# Altium schematic symbol library 13-Logic 数字 IC.SchLib: 324 symbols (part 6 of 30) (continued)
## CY7C1460AV25-250BZ
designator IC?
36-Mbit (1M x 36) Pipelined SRAM with NoBL Architecture
part A pins: A2 A (in), A3 ~{CE1} (in), A4 ~{BWc} (in), A5 ~{BWb} (in), A6 ~{CE3} (in), A7 ~{CEN} (in), A8 ADV/~{LD} (in), A9 A (in), A10 A (in), B2 A (in), B3 CE2 (in), B4 ~{BWd} (in), B5 ~{BWa} (in), B6 CLK (in), B7 ~{WE} (in), B8 ~{OE} (in), B9 A (in), B10 A (in), C1 DQPc (io), C11 DQPb (io), D1 DQc (io), D2 DQc (io), D10 DQb (io), D11 DQb (io), E1 DQc (io), E2 DQc (io), E10 DQb (io), E11 DQb (io), F1 DQc (io), F2 DQc (io), F10 DQb (io), F11 DQb (io), G1 DQc (io), G2 DQc (io), G10 DQb (io), G11 DQb (io), H11 ZZ (in), J1 DQd (io), J2 DQd (io), J10 DQa (io), J11 DQa (io), K1 DQd (io), K2 DQd (io), K10 DQa (io), K11 DQa (io), L1 DQd (io), L2 DQd (io), L10 DQa (io), L11 DQa (io), M1 DQd (io), M2 DQd (io), M10 DQa (io), M11 DQa (io), N1 DQPd (io), N11 DQPa (io), P3 A (in), P4 A (in), P5 TDI (in), P6 A1 (in), P7 TDO (out), P8 A (in), P9 A (in), P10 A (in), R1 MODE (in), R2 A (in), R3 A (in), R4 A (in), R5 TMS (in), R6 A0 (in), R7 TCK (in), R8 A (in), R9 A (in), R10 A (in), R11 A (in)
part B pins: A1 NC/576M, A11 NC, B1 NC/1G, B11 NC, C2 NC, C3 VDDQ (power), C4 VSS (power), C5 VSS (power), C6 VSS (power), C7 VSS (power), C8 VSS (power), C9 VDDQ (power), C10 NC, D3 VDDQ (power), D4 VDD (power), D5 VSS (power), D6 VSS (power), D7 VSS (power), D8 VDD (power), D9 VDDQ (power), E3 VDDQ (power), E4 VDD (power), E5 VSS (power), E6 VSS (power), E7 VSS (power), E8 VDD (power), E9 VDDQ (power), F3 VDDQ (power), F4 VDD (power), F5 VSS (power), F6 VSS (power), F7 VSS (power), F8 VDD (power), F9 VDDQ (power), G3 VDDQ (power), G4 VDD (power), G5 VSS (power), G6 VSS (power), G7 VSS (power), G8 VDD (power), G9 VDDQ (power), H1 NC, H2 NC, H3 NC, H4 VDD (power), H5 VSS (power), H6 VSS (power), H7 VSS (power), H8 VDD (power), H9 NC, H10 NC, J3 VDDQ (power), J4 VDD (power), J5 VSS (power), J6 VSS (power), J7 VSS (power), J8 VDD (power), J9 VDDQ (power), K3 VDDQ (power), K4 VDD (power), K5 VSS (power), K6 VSS (power), K7 VSS (power), K8 VDD (power), K9 VDDQ (power), L3 VDDQ (power), L4 VDD (power), L5 VSS (power), L6 VSS (power), L7 VSS (power), L8 VDD (power), L9 VDDQ (power), M3 VDDQ (power), M4 VDD (power), M5 VSS (power), M6 VSS (power), M7 VSS (power), M8 VDD (power), M9 VDDQ (power), N2 NC (in), N3 VDDQ (power), N4 VSS (power), N5 NC, N6 NC, N7 NC, N8 VSS (power), N9 VDDQ (power), N10 NC, P1 NC/144M, P2 NC/72M, P11 NC/288M

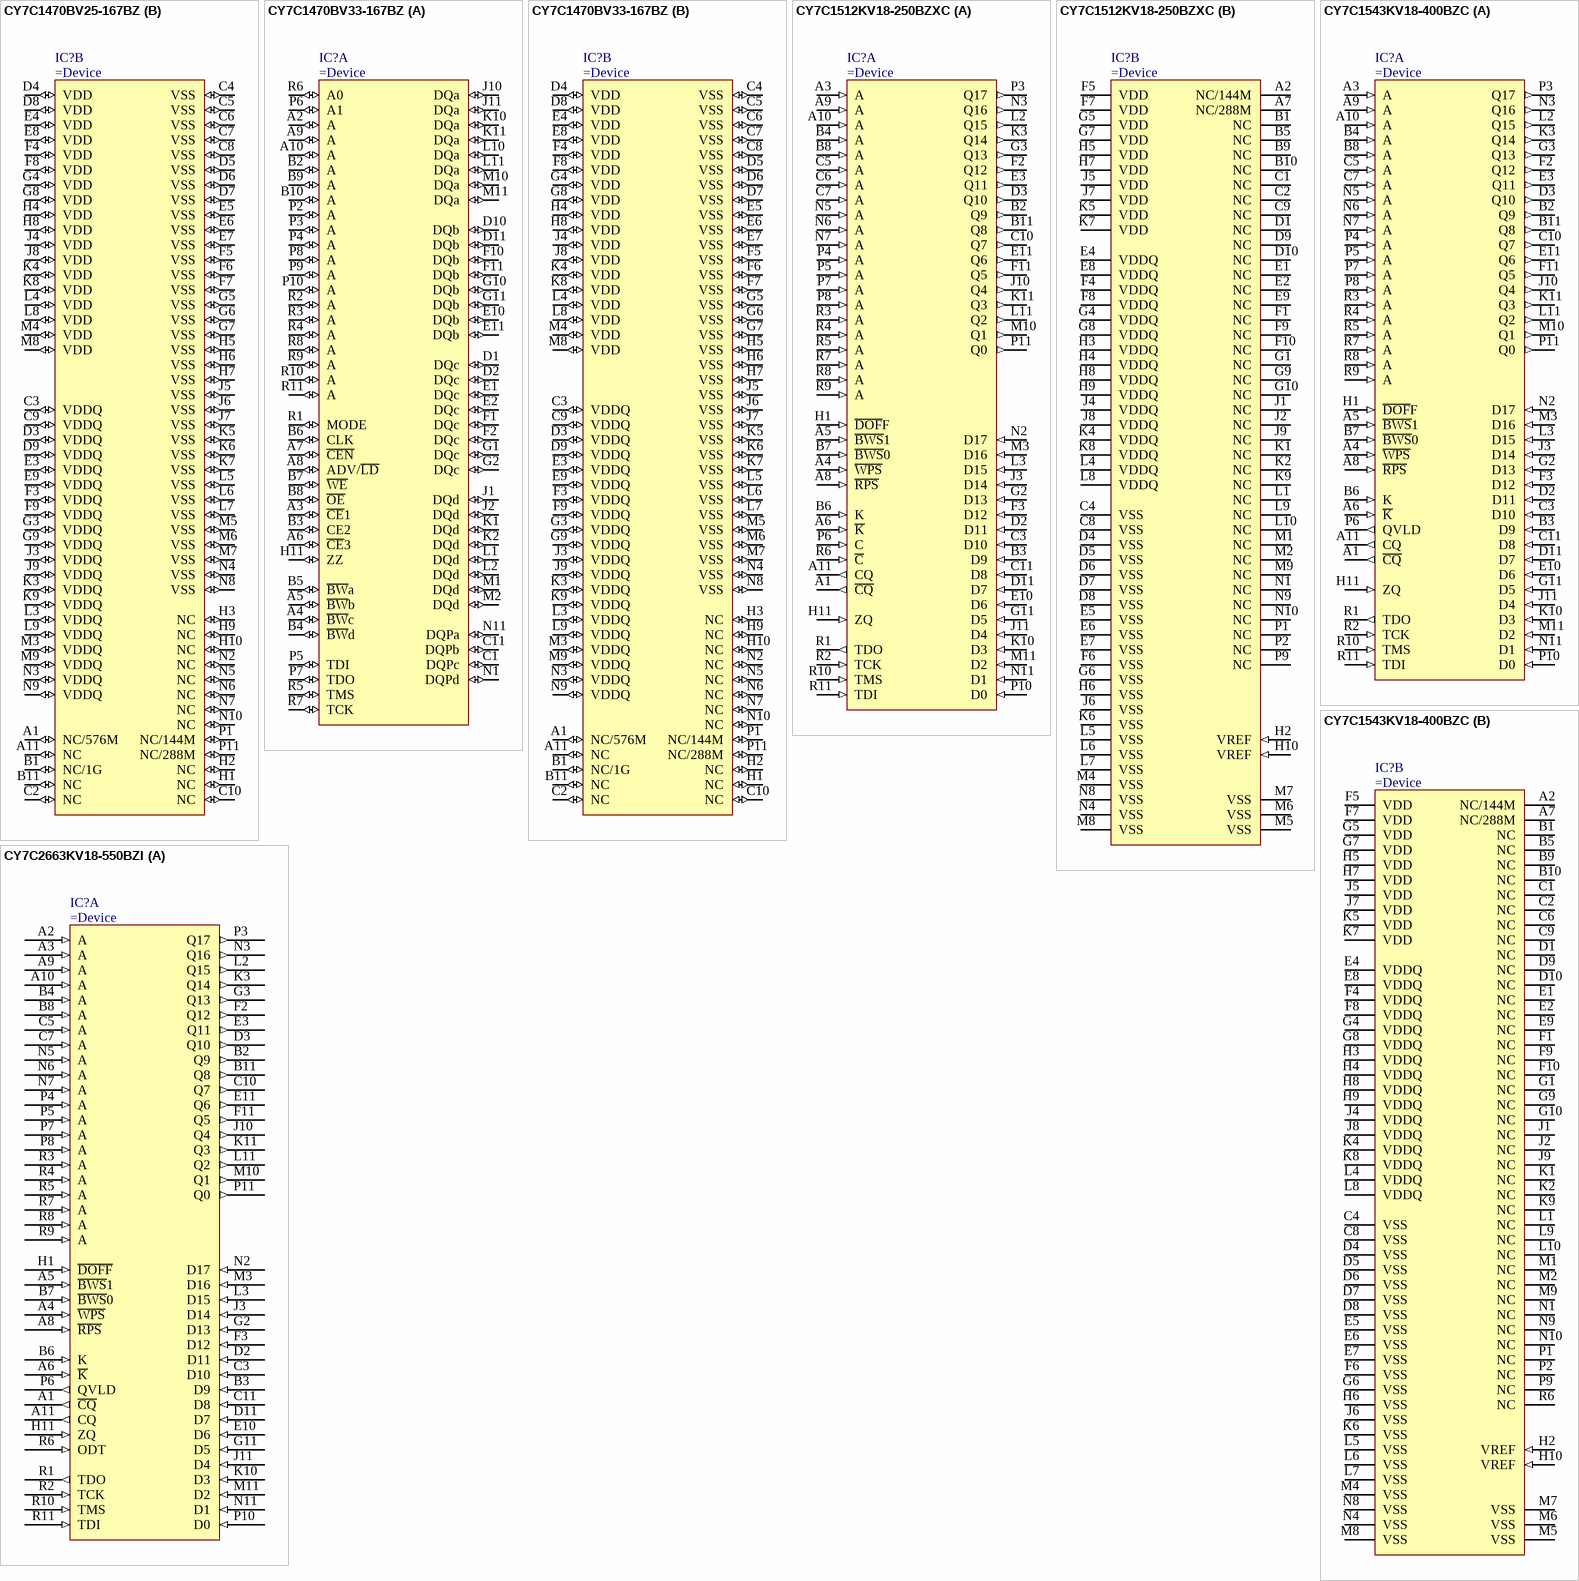
[diagram p34: symbols CY7C1470BV25-167BZ to CY7C2663KV18-550BZI]

## CY7C1470BV25-167BZ
designator IC?
72-Mbit (2M x 36) Pipelined SRAM with NoBL Architecture
part A pins: A2 A (io), A3 ~{CE}1 (io), A4 ~{BW}c (io), A5 ~{BW}b (io), A6 ~{CE}3 (io), A7 ~{CEN} (io), A8 ADV/~{LD} (io), A9 A (io), A10 A (io), B2 A (io), B3 CE2 (io), B4 ~{BW}d (io), B5 ~{BW}a (io), B6 CLK (io), B7 ~{WE} (io), B8 ~{OE} (io), B9 A (io), B10 A (io), C1 DQPc (io), C11 DQPb (io), D1 DQc (io), D2 DQc (io), D10 DQb (io), D11 DQb (io), E1 DQc (io), E2 DQc (io), E10 DQb (io), E11 DQb (io), F1 DQc (io), F2 DQc (io), F10 DQb (io), F11 DQb (io), G1 DQc (io), G2 DQc (io), G10 DQb (io), G11 DQb (io), H11 ZZ (io), J1 DQd (io), J2 DQd (io), J10 DQa (io), J11 DQa (io), K1 DQd (io), K2 DQd (io), K10 DQa (io), K11 DQa (io), L1 DQd (io), L2 DQd (io), L10 DQa (io), L11 DQa (io), M1 DQd (io), M2 DQd (io), M10 DQa (io), M11 DQa (io), N1 DQPd (io), N11 DQPa (io), P2 A (io), P3 A (io), P4 A (io), P5 TDI (io), P6 A1 (io), P7 TDO (io), P8 A (io), P9 A (io), P10 A (io), R1 MODE (io), R2 A (io), R3 A (io), R4 A (io), R5 TMS (io), R6 A0 (io), R7 TCK (io), R8 A (io), R9 A (io), R10 A (io), R11 A (io)
part B pins: A1 NC/576M (io), A11 NC (io), B1 NC/1G (io), B11 NC (io), C2 NC (io), C3 VDDQ (io), C4 VSS (io), C5 VSS (io), C6 VSS (io), C7 VSS (io), C8 VSS (io), C9 VDDQ (io), C10 NC (io), D3 VDDQ (io), D4 VDD (io), D5 VSS (io), D6 VSS (io), D7 VSS (io), D8 VDD (io), D9 VDDQ (io), E3 VDDQ (io), E4 VDD (io), E5 VSS (io), E6 VSS (io), E7 VSS (io), E8 VDD (io), E9 VDDQ (io), F3 VDDQ (io), F4 VDD (io), F5 VSS (io), F6 VSS (io), F7 VSS (io), F8 VDD (io), F9 VDDQ (io), G3 VDDQ (io), G4 VDD (io), G5 VSS (io), G6 VSS (io), G7 VSS (io), G8 VDD (io), G9 VDDQ (io), H1 NC (io), H2 NC (io), H3 NC (io), H4 VDD (io), H5 VSS (io), H6 VSS (io), H7 VSS (io), H8 VDD (io), H9 NC (io), H10 NC (io), J3 VDDQ (io), J4 VDD (io), J5 VSS (io), J6 VSS (io), J7 VSS (io), J8 VDD (io), J9 VDDQ (io), K3 VDDQ (io), K4 VDD (io), K5 VSS (io), K6 VSS (io), K7 VSS (io), K8 VDD (io), K9 VDDQ (io), L3 VDDQ (io), L4 VDD (io), L5 VSS (io), L6 VSS (io), L7 VSS (io), L8 VDD (io), L9 VDDQ (io), M3 VDDQ (io), M4 VDD (io), M5 VSS (io), M6 VSS (io), M7 VSS (io), M8 VDD (io), M9 VDDQ (io), N2 NC (io), N3 VDDQ (io), N4 VSS (io), N5 NC (io), N6 NC (io), N7 NC (io), N8 VSS (io), N9 VDDQ (io), N10 NC (io), P1 NC/144M (io), P11 NC/288M (io)

## CY7C1470BV33-167BZ
designator IC?
72-Mbit (2M x 36) Pipelined 3.3V SRAM with NoBL Architecture
part A pins: A2 A (io), A3 ~{CE}1 (io), A4 ~{BW}c (io), A5 ~{BW}b (io), A6 ~{CE}3 (io), A7 ~{CEN} (io), A8 ADV/~{LD} (io), A9 A (io), A10 A (io), B2 A (io), B3 CE2 (io), B4 ~{BW}d (io), B5 ~{BW}a (io), B6 CLK (io), B7 ~{WE} (io), B8 ~{OE} (io), B9 A (io), B10 A (io), C1 DQPc (io), C11 DQPb (io), D1 DQc (io), D2 DQc (io), D10 DQb (io), D11 DQb (io), E1 DQc (io), E2 DQc (io), E10 DQb (io), E11 DQb (io), F1 DQc (io), F2 DQc (io), F10 DQb (io), F11 DQb (io), G1 DQc (io), G2 DQc (io), G10 DQb (io), G11 DQb (io), H11 ZZ (io), J1 DQd (io), J2 DQd (io), J10 DQa (io), J11 DQa (io), K1 DQd (io), K2 DQd (io), K10 DQa (io), K11 DQa (io), L1 DQd (io), L2 DQd (io), L10 DQa (io), L11 DQa (io), M1 DQd (io), M2 DQd (io), M10 DQa (io), M11 DQa (io), N1 DQPd (io), N11 DQPa (io), P2 A (io), P3 A (io), P4 A (io), P5 TDI (io), P6 A1 (io), P7 TDO (io), P8 A (io), P9 A (io), P10 A (io), R1 MODE (io), R2 A (io), R3 A (io), R4 A (io), R5 TMS (io), R6 A0 (io), R7 TCK (io), R8 A (io), R9 A (io), R10 A (io), R11 A (io)
part B pins: A1 NC/576M (io), A11 NC (io), B1 NC/1G (io), B11 NC (io), C2 NC (io), C3 VDDQ (io), C4 VSS (io), C5 VSS (io), C6 VSS (io), C7 VSS (io), C8 VSS (io), C9 VDDQ (io), C10 NC (io), D3 VDDQ (io), D4 VDD (io), D5 VSS (io), D6 VSS (io), D7 VSS (io), D8 VDD (io), D9 VDDQ (io), E3 VDDQ (io), E4 VDD (io), E5 VSS (io), E6 VSS (io), E7 VSS (io), E8 VDD (io), E9 VDDQ (io), F3 VDDQ (io), F4 VDD (io), F5 VSS (io), F6 VSS (io), F7 VSS (io), F8 VDD (io), F9 VDDQ (io), G3 VDDQ (io), G4 VDD (io), G5 VSS (io), G6 VSS (io), G7 VSS (io), G8 VDD (io), G9 VDDQ (io), H1 NC (io), H2 NC (io), H3 NC (io), H4 VDD (io), H5 VSS (io), H6 VSS (io), H7 VSS (io), H8 VDD (io), H9 NC (io), H10 NC (io), J3 VDDQ (io), J4 VDD (io), J5 VSS (io), J6 VSS (io), J7 VSS (io), J8 VDD (io), J9 VDDQ (io), K3 VDDQ (io), K4 VDD (io), K5 VSS (io), K6 VSS (io), K7 VSS (io), K8 VDD (io), K9 VDDQ (io), L3 VDDQ (io), L4 VDD (io), L5 VSS (io), L6 VSS (io), L7 VSS (io), L8 VDD (io), L9 VDDQ (io), M3 VDDQ (io), M4 VDD (io), M5 VSS (io), M6 VSS (io), M7 VSS (io), M8 VDD (io), M9 VDDQ (io), N2 NC (io), N3 VDDQ (io), N4 VSS (io), N5 NC (io), N6 NC (io), N7 NC (io), N8 VSS (io), N9 VDDQ (io), N10 NC (io), P1 NC/144M (io), P11 NC/288M (io)

## CY7C1512KV18-250BZXC
designator IC?
72-Mbit QDR® II SRAM 2-Word Burst Architecture
part A pins: A1 ~{CQ} (out), A3 A (in), A4 ~{WPS} (in), A5 ~{BWS}1 (in), A6 ~{K} (in), A8 ~{RPS} (in), A9 A (in), A10 A (in), A11 CQ (out), B2 Q9 (out), B3 D9 (in), B4 A (in), B6 K (in), B7 ~{BWS}0 (in), B8 A (in), B11 Q8 (out), C3 D10 (in), C5 A (in), C6 A (in), C7 A (in), C10 Q7 (out), C11 D8 (in), D2 D11 (in), D3 Q10 (out), D11 D7 (in), E3 Q11 (out), E10 D6 (in), E11 Q6 (out), F2 Q12 (out), F3 D12 (in), F11 Q5 (out), G2 D13 (in), G3 Q13 (out), G11 D5 (in), H1 ~{DOF}F (in), H11 ZQ (in), J3 D14 (in), J10 Q4 (out), J11 D4 (in), K3 Q14 (out), K10 D3 (in), K11 Q3 (out), L2 Q15 (out), L3 D15 (in), L11 Q2 (out), M3 D16 (in), M10 Q1 (out), M11 D2 (in), N2 D17 (in), N3 Q16 (out), N5 A (in), N6 A (in), N7 A (in), N11 D1 (in), P3 Q17 (out), P4 A (in), P5 A (in), P6 C (in), P7 A (in), P8 A (in), P10 D0 (in), P11 Q0 (out), R1 TDO (out), R2 TCK (in), R3 A (in), R4 A (in), R5 A (in), R6 ~{C} (in), R7 A (in), R8 A (in), R9 A (in), R10 TMS (in), R11 TDI (in)
part B pins: A2 NC/144M, A7 NC/288M, B1 NC, B5 NC, B9 NC, B10 NC, C1 NC, C2 NC, C4 VSS (power), C8 VSS (power), C9 NC, D1 NC, D4 VSS (power), D5 VSS (power), D6 VSS (power), D7 VSS (power), D8 VSS (power), D9 NC, D10 NC, E1 NC, E2 NC, E4 VDDQ (power), E5 VSS (power), E6 VSS (power), E7 VSS (power), E8 VDDQ (power), E9 NC, F1 NC, F4 VDDQ (power), F5 VDD (power), F6 VSS (power), F7 VDD (power), F8 VDDQ (power), F9 NC, F10 NC, G1 NC, G4 VDDQ (power), G5 VDD (power), G6 VSS (power), G7 VDD (power), G8 VDDQ (power), G9 NC, G10 NC, H2 VREF (in), H3 VDDQ (power), H4 VDDQ (power), H5 VDD (power), H6 VSS (power), H7 VDD (power), H8 VDDQ (power), H9 VDDQ (power), H10 VREF (in), J1 NC, J2 NC, J4 VDDQ (power), J5 VDD (power), J6 VSS (power), J7 VDD (power), J8 VDDQ (power), J9 NC, K1 NC, K2 NC, K4 VDDQ (power), K5 VDD (power), K6 VSS (power), K7 VDD (power), K8 VDDQ (power), K9 NC, L1 NC, L4 VDDQ (power), L5 VSS (power), L6 VSS (power), L7 VSS (power), L8 VDDQ (power), L9 NC, L10 NC, M1 NC, M2 NC, M4 VSS (power), M5 VSS (power), M6 VSS (power), M7 VSS (power), M8 VSS (power), M9 NC, N1 NC, N4 VSS (power), N8 VSS (power), N9 NC, N10 NC, P1 NC, P2 NC, P9 NC

## CY7C1543KV18-400BZC
designator IC?
72-Mbit QDR®II+ SRAM 4-Word Burst Architecture (2.0 Cycle Read Latency)
part A pins: A1 ~{CQ} (out), A3 A (in), A4 ~{WPS} (in), A5 ~{BWS}1 (in), A6 ~{K} (in), A8 ~{RPS} (in), A9 A (in), A10 A (in), A11 CQ (out), B2 Q9 (out), B3 D9 (in), B4 A (in), B6 K (in), B7 ~{BWS}0 (in), B8 A (in), B11 Q8 (out), C3 D10 (in), C5 A (in), C7 A (in), C10 Q7 (out), C11 D8 (in), D2 D11 (in), D3 Q10 (out), D11 D7 (in), E3 Q11 (out), E10 D6 (in), E11 Q6 (out), F2 Q12 (out), F3 D12 (in), F11 Q5 (out), G2 D13 (in), G3 Q13 (out), G11 D5 (in), H1 ~{DOF}F (in), H11 ZQ (in), J3 D14 (in), J10 Q4 (out), J11 D4 (in), K3 Q14 (out), K10 D3 (in), K11 Q3 (out), L2 Q15 (out), L3 D15 (in), L11 Q2 (out), M3 D16 (in), M10 Q1 (out), M11 D2 (in), N2 D17 (in), N3 Q16 (out), N5 A (in), N6 A (in), N7 A (in), N11 D1 (in), P3 Q17 (out), P4 A (in), P5 A (in), P6 QVLD (out), P7 A (in), P8 A (in), P10 D0 (in), P11 Q0 (out), R1 TDO (out), R2 TCK (in), R3 A (in), R4 A (in), R5 A (in), R7 A (in), R8 A (in), R9 A (in), R10 TMS (in), R11 TDI (in)
part B pins: A2 NC/144M, A7 NC/288M, B1 NC, B5 NC, B9 NC, B10 NC, C1 NC, C2 NC, C4 VSS (power), C6 NC, C8 VSS (power), C9 NC, D1 NC, D4 VSS (power), D5 VSS (power), D6 VSS (power), D7 VSS (power), D8 VSS (power), D9 NC, D10 NC, E1 NC, E2 NC, E4 VDDQ (power), E5 VSS (power), E6 VSS (power), E7 VSS (power), E8 VDDQ (power), E9 NC, F1 NC, F4 VDDQ (power), F5 VDD (power), F6 VSS (power), F7 VDD (power), F8 VDDQ (power), F9 NC, F10 NC, G1 NC, G4 VDDQ (power), G5 VDD (power), G6 VSS (power), G7 VDD (power), G8 VDDQ (power), G9 NC, G10 NC, H2 VREF (in), H3 VDDQ (power), H4 VDDQ (power), H5 VDD (power), H6 VSS (power), H7 VDD (power), H8 VDDQ (power), H9 VDDQ (power), H10 VREF (in), J1 NC, J2 NC, J4 VDDQ (power), J5 VDD (power), J6 VSS (power), J7 VDD (power), J8 VDDQ (power), J9 NC, K1 NC, K2 NC, K4 VDDQ (power), K5 VDD (power), K6 VSS (power), K7 VDD (power), K8 VDDQ (power), K9 NC, L1 NC, L4 VDDQ (power), L5 VSS (power), L6 VSS (power), L7 VSS (power), L8 VDDQ (power), L9 NC, L10 NC, M1 NC, M2 NC, M4 VSS (power), M5 VSS (power), M6 VSS (power), M7 VSS (power), M8 VSS (power), M9 NC, N1 NC, N4 VSS (power), N8 VSS (power), N9 NC, N10 NC, P1 NC, P2 NC, P9 NC, R6 NC

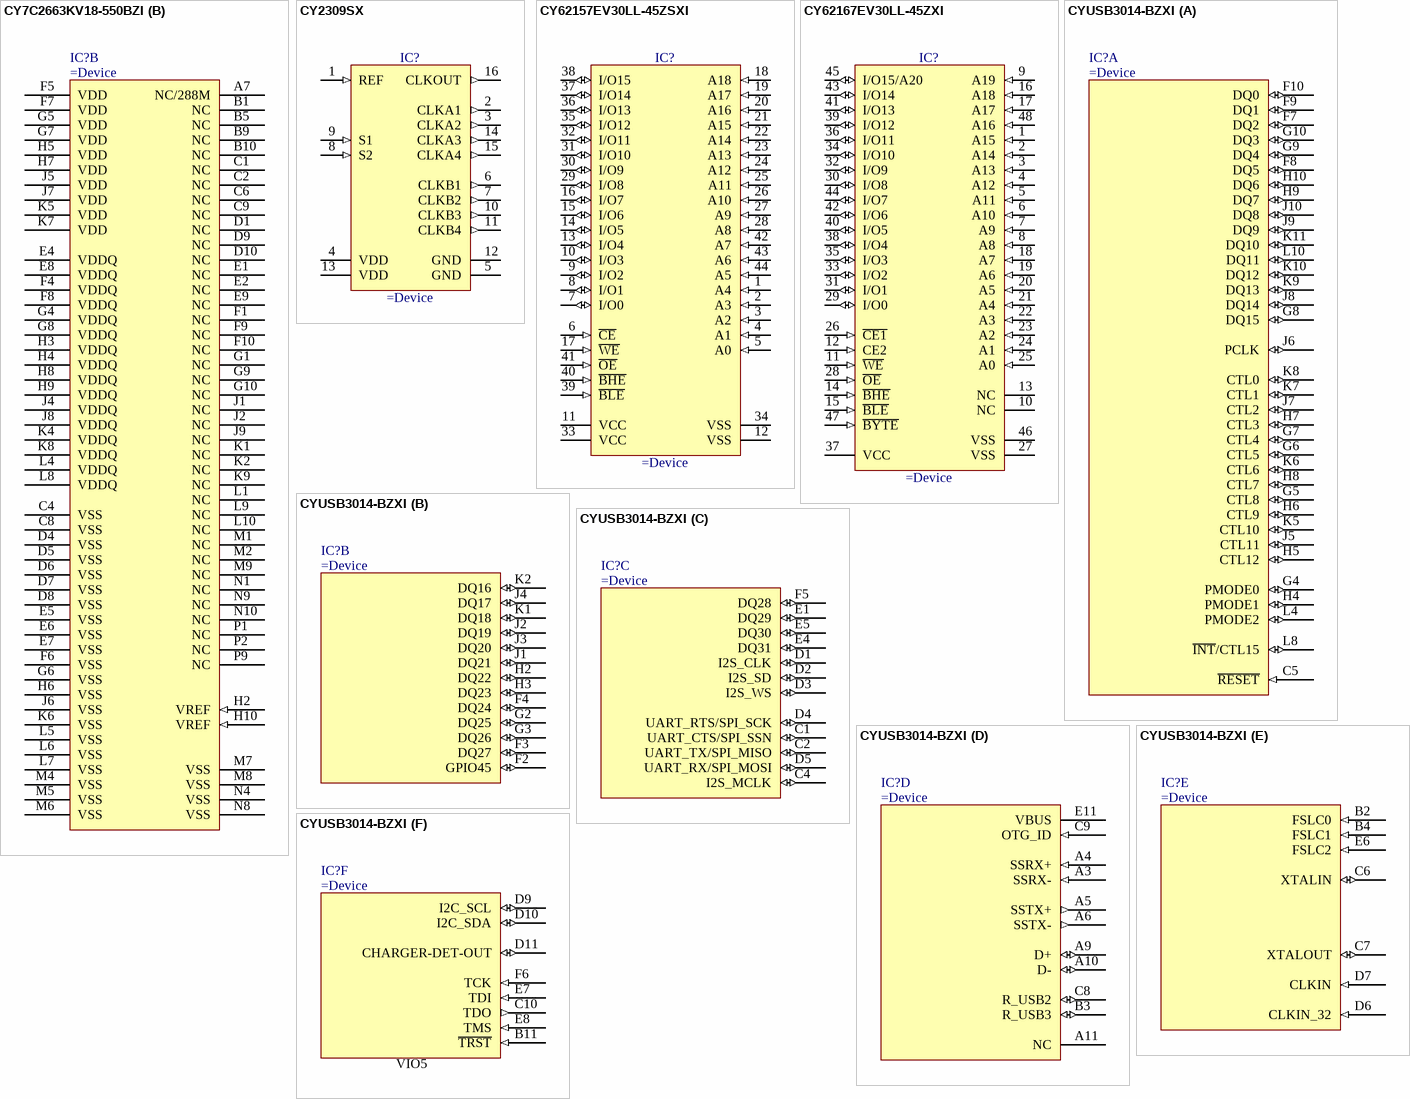
[diagram p35: symbols CY7C2663KV18-550BZI to CYUSB3014-BZXI]

## CY7C2663KV18-550BZI
designator IC?
144-Mbit QDR® II+ SRAM Four-Word Burst Architecture (2.5 Cycle Read Latency) with ODT
part A pins: A1 ~{CQ} (out), A2 A (in), A3 A (in), A4 ~{WPS} (in), A5 ~{BWS}1 (in), A6 ~{K} (in), A8 ~{RPS} (in), A9 A (in), A10 A (in), A11 CQ (out), B2 Q9 (out), B3 D9 (in), B4 A (in), B6 K (in), B7 ~{BWS}0 (in), B8 A (in), B11 Q8 (out), C3 D10 (in), C5 A (in), C7 A (in), C10 Q7 (out), C11 D8 (in), D2 D11 (in), D3 Q10 (out), D11 D7 (in), E3 Q11 (out), E10 D6 (in), E11 Q6 (out), F2 Q12 (out), F3 D12 (in), F11 Q5 (out), G2 D13 (in), G3 Q13 (out), G11 D5 (in), H1 ~{DOFF} (in), H11 ZQ (in), J3 D14 (in), J10 Q4 (out), J11 D4 (in), K3 Q14 (out), K10 D3 (in), K11 Q3 (out), L2 Q15 (out), L3 D15 (in), L11 Q2 (out), M3 D16 (in), M10 Q1 (out), M11 D2 (in), N2 D17 (in), N3 Q16 (out), N5 A (in), N6 A (in), N7 A (in), N11 D1 (in), P3 Q17 (out), P4 A (in), P5 A (in), P6 QVLD (out), P7 A (in), P8 A (in), P10 D0 (in), P11 Q0 (out), R1 TDO (out), R2 TCK (in), R3 A (in), R4 A (in), R5 A (in), R6 ODT (in), R7 A (in), R8 A (in), R9 A (in), R10 TMS (in), R11 TDI (in)
part B pins: A7 NC/288M, B1 NC, B5 NC, B9 NC, B10 NC, C1 NC, C2 NC, C4 VSS (power), C6 NC, C8 VSS (power), C9 NC, D1 NC, D4 VSS (power), D5 VSS (power), D6 VSS (power), D7 VSS (power), D8 VSS (power), D9 NC, D10 NC, E1 NC, E2 NC, E4 VDDQ (power), E5 VSS (power), E6 VSS (power), E7 VSS (power), E8 VDDQ (power), E9 NC, F1 NC, F4 VDDQ (power), F5 VDD (power), F6 VSS (power), F7 VDD (power), F8 VDDQ (power), F9 NC, F10 NC, G1 NC, G4 VDDQ (power), G5 VDD (power), G6 VSS (power), G7 VDD (power), G8 VDDQ (power), G9 NC, G10 NC, H2 VREF (in), H3 VDDQ (power), H4 VDDQ (power), H5 VDD (power), H6 VSS (power), H7 VDD (power), H8 VDDQ (power), H9 VDDQ (power), H10 VREF (in), J1 NC, J2 NC, J4 VDDQ (power), J5 VDD (power), J6 VSS (power), J7 VDD (power), J8 VDDQ (power), J9 NC, K1 NC, K2 NC, K4 VDDQ (power), K5 VDD (power), K6 VSS (power), K7 VDD (power), K8 VDDQ (power), K9 NC, L1 NC, L4 VDDQ (power), L5 VSS (power), L6 VSS (power), L7 VSS (power), L8 VDDQ (power), L9 NC, L10 NC, M1 NC, M2 NC, M4 VSS (power), M5 VSS (power), M6 VSS (power), M7 VSS (power), M8 VSS (power), M9 NC, N1 NC, N4 VSS (power), N8 VSS (power), N9 NC, N10 NC, P1 NC, P2 NC, P9 NC

## CY2309SX
designator IC?
Low Cost 3.3-V Zero Delay Buffer
pins: 1 REF (in), 2 CLKA1 (out), 3 CLKA2 (out), 4 VDD (power), 5 GND (power), 6 CLKB1 (out), 7 CLKB2 (out), 8 S2 (in), 9 S1 (in), 10 CLKB3 (out), 11 CLKB4 (out), 12 GND (power), 13 VDD (power), 14 CLKA3 (out), 15 CLKA4 (out), 16 CLKOUT (out)

## CY62157EV30LL-45ZSXI
designator IC?
8-Mbit (512 K × 16) Static RAM
pins: 1 A4 (in), 2 A3 (in), 3 A2 (in), 4 A1 (in), 5 A0 (in), 6 ~{CE} (in), 7 I/O0 (io), 8 I/O1 (io), 9 I/O2 (io), 10 I/O3 (io), 11 VCC (power), 12 VSS (power), 13 I/O4 (io), 14 I/O5 (io), 15 I/O6 (io), 16 I/O7 (io), 17 ~{WE} (in), 18 A18 (in), 19 A17 (in), 20 A16 (in), 21 A15 (in), 22 A14 (in), 23 A13 (in), 24 A12 (in), 25 A11 (in), 26 A10 (in), 27 A9 (in), 28 A8 (in), 29 I/O8 (io), 30 I/O9 (io), 31 I/O10 (io), 32 I/O11 (io), 33 VCC (power), 34 VSS (power), 35 I/O12 (io), 36 I/O13 (io), 37 I/O14 (io), 38 I/O15 (io), 39 ~{BLE} (in), 40 ~{BHE} (in), 41 ~{OE} (in), 42 A7 (in), 43 A6 (in), 44 A5 (in)

## CY62167EV30LL-45ZXI
designator IC?
16Mbit (1M x 16), 2.2V to 3.6V Static RAM
pins: 1 A15 (in), 2 A14 (in), 3 A13 (in), 4 A12 (in), 5 A11 (in), 6 A10 (in), 7 A9 (in), 8 A8 (in), 9 A19 (in), 10 NC, 11 ~{WE} (in), 12 CE2 (in), 13 NC, 14 ~{BHE} (in), 15 ~{BLE} (in), 16 A18 (in), 17 A17 (in), 18 A7 (in), 19 A6 (in), 20 A5 (in), 21 A4 (in), 22 A3 (in), 23 A2 (in), 24 A1 (in), 25 A0 (in), 26 ~{CE1} (in), 27 VSS (power), 28 ~{OE} (in), 29 I/O0 (io), 30 I/O8 (io), 31 I/O1 (io), 32 I/O9 (io), 33 I/O2 (io), 34 I/O10 (io), 35 I/O3 (io), 36 I/O11 (io), 37 VCC (power), 38 I/O4 (io), 39 I/O12 (io), 40 I/O5 (io), 41 I/O13 (io), 42 I/O6 (io), 43 I/O14 (io), 44 I/O7 (io), 45 I/O15/A20 (io), 46 VSS (power), 47 ~{BYTE} (in), 48 A16 (in)

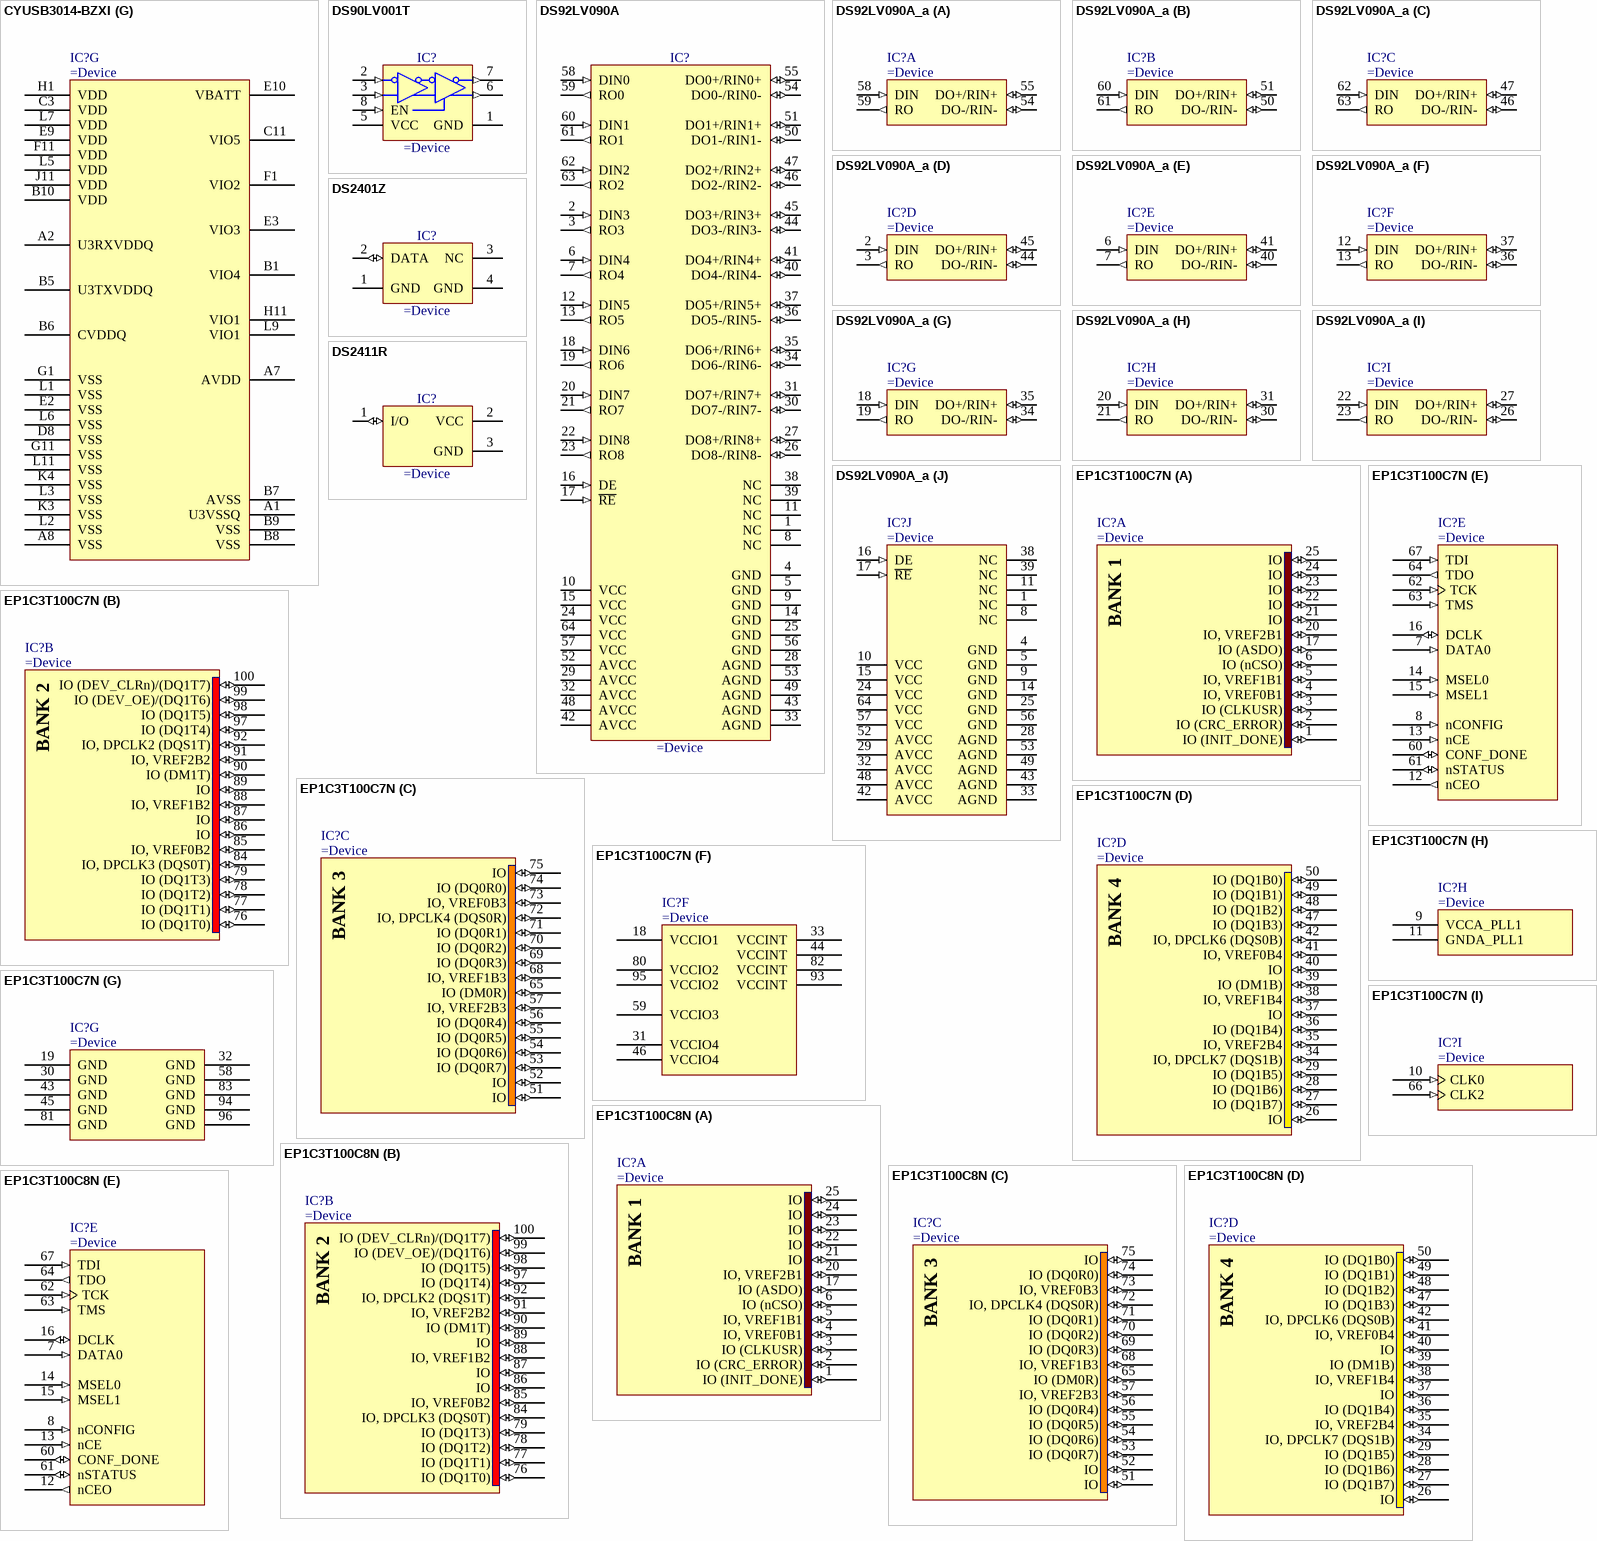
[diagram p36: symbols CYUSB3014-BZXI to EP1C3T100C8N]

## CYUSB3014-BZXI
designator IC?
EZ-USB® FX3 SuperSpeed USB Controller
part A pins: C5 ~{RESET} (in), F7 DQ2 (io), F8 DQ5 (io), F9 DQ1 (io), F10 DQ0 (io), G4 PMODE0 (io), G5 CTL8 (io), G6 CTL5 (io), G7 CTL4 (io), G8 DQ15 (io), G9 DQ4 (io), G10 DQ3 (io), H4 PMODE1 (io), H5 CTL12 (io), H6 CTL9 (io), H7 CTL3 (io), H8 CTL7 (io), H9 DQ7 (io), H10 DQ6 (io), J5 CTL11 (io), J6 PCLK (io), J7 CTL2 (io), J8 DQ14 (io), J9 DQ9 (io), J10 DQ8 (io), K5 CTL10 (io), K6 CTL6 (io), K7 CTL1 (io), K8 CTL0 (io), K9 DQ13 (io), K10 DQ12 (io), K11 DQ10 (io), L4 PMODE2 (io), L8 ~{INT}/CTL15 (io), L10 DQ11 (io)
part B pins: F2 GPIO45 (io), F3 DQ27 (io), F4 DQ24 (io), G2 DQ25 (io), G3 DQ26 (io), H2 DQ22 (io), H3 DQ23 (io), J1 DQ21 (io), J2 DQ19 (io), J3 DQ20 (io), J4 DQ17 (io), K1 DQ18 (io), K2 DQ16 (io)
part C pins: C1 UART_CTS/SPI_SSN (io), C2 UART_TX/SPI_MISO (io), C4 I2S_MCLK (io), D1 I2S_CLK (io), D2 I2S_SD (io), D3 I2S_WS (io), D4 UART_RTS/SPI_SCK (io), D5 UART_RX/SPI_MOSI (io), E1 DQ29 (io), E4 DQ31 (io), E5 DQ30 (io), F5 DQ28 (io)
part D pins: A3 SSRX- (in), A4 SSRX+ (in), A5 SSTX+ (out), A6 SSTX- (out), A9 D+ (io), A10 D- (io), A11 NC, B3 R_USB3 (io), C8 R_USB2 (io), C9 OTG_ID (in), E11 VBUS (power)
part E pins: B2 FSLC0 (in), B4 FSLC1 (in), C6 XTALIN (io), C7 XTALOUT (io), D6 CLKIN_32 (in), D7 CLKIN (in), E6 FSLC2 (in)
part F pins: B11 ~{TRST} (in), C10 TDO (out), D9 I2C_SCL (io), D10 I2C_SDA (io), D11 CHARGER-DET-OUT (io), E7 TDI (in), E8 TMS (in), F6 TCK (in)
part G pins: A1 U3VSSQ (power), A2 U3RXVDDQ (power), A7 AVDD (power), A8 VSS (power), B1 VIO4 (power), B5 U3TXVDDQ (power), B6 CVDDQ (power), B7 AVSS (power), B8 VSS (power), B9 VSS (power), B10 VDD (power), C3 VDD (power), C11 VIO5 (power), D8 VSS (power), E2 VSS (power), E3 VIO3 (power), E9 VDD (power), E10 VBATT (power), F1 VIO2 (power), F11 VDD (power), G1 VSS (power), G11 VSS (power), H1 VDD (power), H11 VIO1 (power), J11 VDD (power), K3 VSS (power), K4 VSS (power), L1 VSS (power), L2 VSS (power), L3 VSS (power), L5 VDD (power), L6 VSS (power), L7 VDD (power), L9 VIO1 (power), L11 VSS (power)

## DS90LV001T
designator IC?
800 Mbps LVDS Buffer
pins: 1 GND (power), 2 IN- (in), 3 IN+ (in), 5 VCC (power), 6 OUT+ (out), 7 OUT- (out), 8 EN (in)

## DS92LV090A
designator IC?
9 Channel Bus LVDS Transceiver
pins: 1 NC, 2 DIN3 (in), 3 RO3 (out), 4 GND (power), 5 GND (power), 6 DIN4 (in), 7 RO4 (out), 8 NC, 9 GND (power), 10 VCC (power), 11 NC, 12 DIN5 (in), 13 RO5 (out), 14 GND (power), 15 VCC (power), 16 DE (in), 17 ~{RE} (in), 18 DIN6 (in), 19 RO6 (out), 20 DIN7 (in), 21 RO7 (out), 22 DIN8 (in), 23 RO8 (out), 24 VCC (power), 25 GND (power), 26 DO8-/RIN8- (io), 27 DO8+/RIN8+ (io), 28 AGND (power), 29 AVCC (power), 30 DO7-/RIN7- (io), 31 DO7+/RIN7+ (io), 32 AVCC (power), 33 AGND (power), 34 DO6-/RIN6- (io), 35 DO6+/RIN6+ (io), 36 DO5-/RIN5- (io), 37 DO5+/RIN5+ (io), 38 NC, 39 NC, 40 DO4-/RIN4- (io), 41 DO4+/RIN4+ (io), 42 AVCC (power), 43 AGND (power), 44 DO3-/RIN3- (io), 45 DO3+/RIN3+ (io), 46 DO2-/RIN2- (io), 47 DO2+/RIN2+ (io), 48 AVCC (power), 49 AGND (power), 50 DO1-/RIN1- (io), 51 DO1+/RIN1+ (io), 52 AVCC (power), 53 AGND (power), 54 DO0-/RIN0- (io), 55 DO0+/RIN0+ (io), 56 GND (power), 57 VCC (power), 58 DIN0 (in), 59 RO0 (out), 60 DIN1 (in), 61 RO1 (out), 62 DIN2 (in), 63 RO2 (out), 64 VCC (power)

## DS92LV090A_a
designator IC?
9 Channel Bus LVDS Transceiver
part A pins: 54 DO-/RIN- (io), 55 DO+/RIN+ (io), 58 DIN (in), 59 RO (out)
part B pins: 50 DO-/RIN- (io), 51 DO+/RIN+ (io), 60 DIN (in), 61 RO (out)
part C pins: 46 DO-/RIN- (io), 47 DO+/RIN+ (io), 62 DIN (in), 63 RO (out)
part D pins: 2 DIN (in), 3 RO (out), 44 DO-/RIN- (io), 45 DO+/RIN+ (io)
part E pins: 6 DIN (in), 7 RO (out), 40 DO-/RIN- (io), 41 DO+/RIN+ (io)
part F pins: 12 DIN (in), 13 RO (out), 36 DO-/RIN- (io), 37 DO+/RIN+ (io)
part G pins: 18 DIN (in), 19 RO (out), 34 DO-/RIN- (io), 35 DO+/RIN+ (io)
part H pins: 20 DIN (in), 21 RO (out), 30 DO-/RIN- (io), 31 DO+/RIN+ (io)
part I pins: 22 DIN (in), 23 RO (out), 26 DO-/RIN- (io), 27 DO+/RIN+ (io)
part J pins: 1 NC, 4 GND (power), 5 GND (power), 8 NC, 9 GND (power), 10 VCC (power), 11 NC, 14 GND (power), 15 VCC (power), 16 DE (in), 17 ~{RE} (in), 24 VCC (power), 25 GND (power), 28 AGND (power), 29 AVCC (power), 32 AVCC (power), 33 AGND (power), 38 NC, 39 NC, 42 AVCC (power), 43 AGND (power), 48 AVCC (power), 49 AGND (power), 52 AVCC (power), 53 AGND (power), 56 GND (power), 57 VCC (power), 64 VCC (power)

## DS2401Z
designator IC?
Silicon Serial Number
pins: 1 GND (power), 2 DATA (io), 3 NC, 4 GND (power)

## DS2411R
designator IC?
Silicon Serial Number with VCC Input
pins: 1 I/O (io), 2 VCC (power), 3 GND (power)

## EP1C3T100C7N
designator IC?
Cyclone Family, 1.5V FPGA, 65 I/O Pins, 1 x PLL, Commercial Grade, Speed Grade 7, Pb-Free
part A pins: 1 IO (INIT_DONE) (io), 2 IO (CRC_ERROR) (io), 3 IO (CLKUSR) (io), 4 IO, VREF0B1 (io), 5 IO, VREF1B1 (io), 6 IO (nCSO) (io), 17 IO (ASDO) (io), 20 IO, VREF2B1 (io), 21 IO (io), 22 IO (io), 23 IO (io), 24 IO (io), 25 IO (io)
part B pins: 76 IO (DQ1T0) (io), 77 IO (DQ1T1) (io), 78 IO (DQ1T2) (io), 79 IO (DQ1T3) (io), 84 IO, DPCLK3 (DQS0T) (io), 85 IO, VREF0B2 (io), 86 IO (io), 87 IO (io), 88 IO, VREF1B2 (io), 89 IO (io), 90 IO (DM1T) (io), 91 IO, VREF2B2 (io), 92 IO, DPCLK2 (DQS1T) (io), 97 IO (DQ1T4) (io), 98 IO (DQ1T5) (io), 99 IO (DEV_OE)/(DQ1T6) (io), 100 IO (DEV_CLRn)/(DQ1T7) (io)
part C pins: 51 IO (io), 52 IO (io), 53 IO (DQ0R7) (io), 54 IO (DQ0R6) (io), 55 IO (DQ0R5) (io), 56 IO (DQ0R4) (io), 57 IO, VREF2B3 (io), 65 IO (DM0R) (io), 68 IO, VREF1B3 (io), 69 IO (DQ0R3) (io), 70 IO (DQ0R2) (io), 71 IO (DQ0R1) (io), 72 IO, DPCLK4 (DQS0R) (io), 73 IO, VREF0B3 (io), 74 IO (DQ0R0) (io), 75 IO (io)
part D pins: 26 IO (io), 27 IO (DQ1B7) (io), 28 IO (DQ1B6) (io), 29 IO (DQ1B5) (io), 34 IO, DPCLK7 (DQS1B) (io), 35 IO, VREF2B4 (io), 36 IO (DQ1B4) (io), 37 IO (io), 38 IO, VREF1B4 (io), 39 IO (DM1B) (io), 40 IO (io), 41 IO, VREF0B4 (io), 42 IO, DPCLK6 (DQS0B) (io), 47 IO (DQ1B3) (io), 48 IO (DQ1B2) (io), 49 IO (DQ1B1) (io), 50 IO (DQ1B0) (io)
part E pins: 7 DATA0 (in), 8 nCONFIG (in), 12 nCEO (out), 13 nCE (in), 14 MSEL0 (in), 15 MSEL1 (in), 16 DCLK (io), 60 CONF_DONE (io), 61 nSTATUS (io), 62 TCK (in), 63 TMS (in), 64 TDO (out), 67 TDI (in)
part F pins: 18 VCCIO1 (power), 31 VCCIO4 (power), 33 VCCINT (power), 44 VCCINT (power), 46 VCCIO4 (power), 59 VCCIO3 (power), 80 VCCIO2 (power), 82 VCCINT (power), 93 VCCINT (power), 95 VCCIO2 (power)
part G pins: 19 GND (power), 30 GND (power), 32 GND (power), 43 GND (power), 45 GND (power), 58 GND (power), 81 GND (power), 83 GND (power), 94 GND (power), 96 GND (power)
part H pins: 9 VCCA_PLL1 (power), 11 GNDA_PLL1 (power)
part I pins: 10 CLK0 (in), 66 CLK2 (in)
part A text: BANK 1
part B text: BANK 2
part C text: BANK 3
part D text: BANK 4

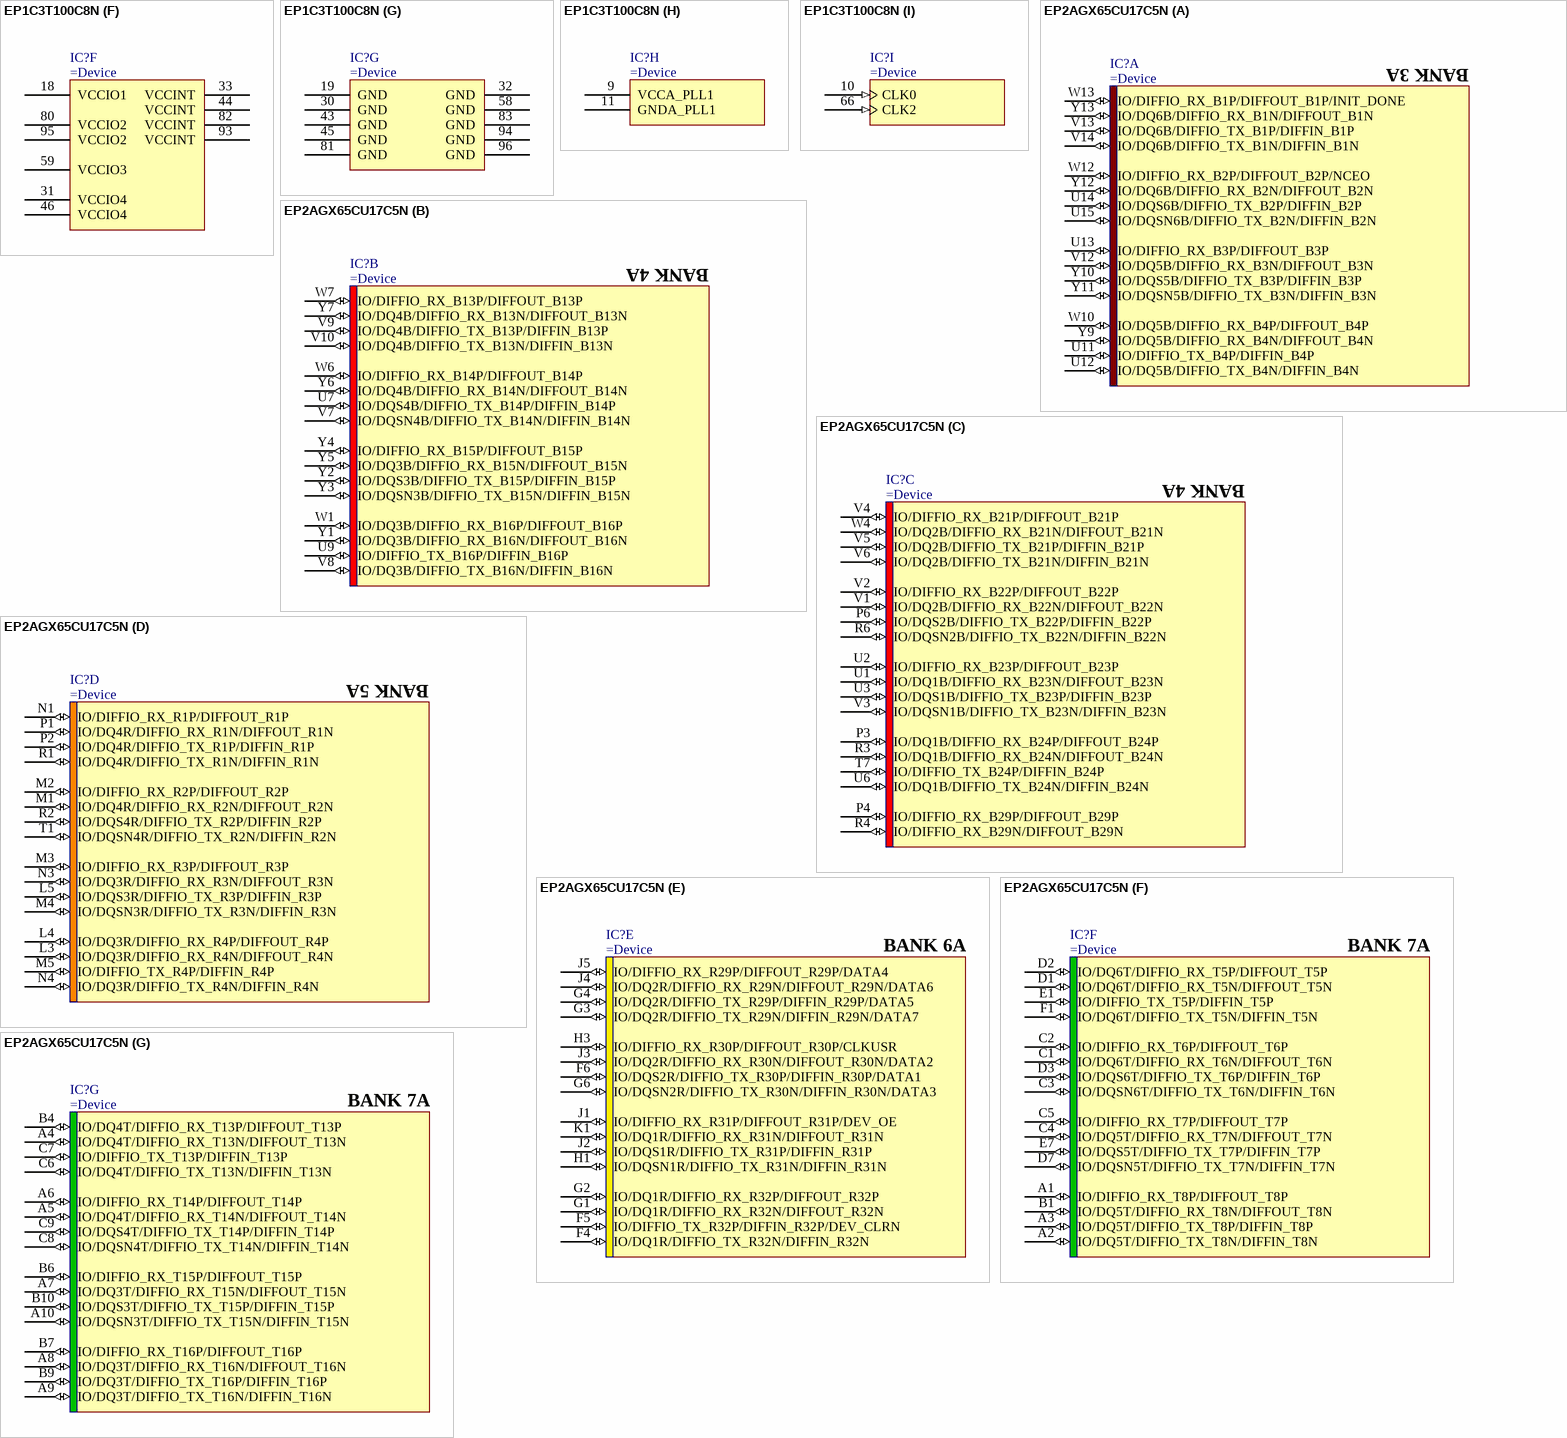
[diagram p37: symbols EP1C3T100C8N to EP2AGX65CU17C5N]

## EP1C3T100C8N
designator IC?
Cyclone Family, 1.5V FPGA, 65 I/O Pins, 1 x PLL, Commercial Grade, Speed Grade 8, Pb-Free
part A pins: 1 IO (INIT_DONE) (io), 2 IO (CRC_ERROR) (io), 3 IO (CLKUSR) (io), 4 IO, VREF0B1 (io), 5 IO, VREF1B1 (io), 6 IO (nCSO) (io), 17 IO (ASDO) (io), 20 IO, VREF2B1 (io), 21 IO (io), 22 IO (io), 23 IO (io), 24 IO (io), 25 IO (io)
part B pins: 76 IO (DQ1T0) (io), 77 IO (DQ1T1) (io), 78 IO (DQ1T2) (io), 79 IO (DQ1T3) (io), 84 IO, DPCLK3 (DQS0T) (io), 85 IO, VREF0B2 (io), 86 IO (io), 87 IO (io), 88 IO, VREF1B2 (io), 89 IO (io), 90 IO (DM1T) (io), 91 IO, VREF2B2 (io), 92 IO, DPCLK2 (DQS1T) (io), 97 IO (DQ1T4) (io), 98 IO (DQ1T5) (io), 99 IO (DEV_OE)/(DQ1T6) (io), 100 IO (DEV_CLRn)/(DQ1T7) (io)
part C pins: 51 IO (io), 52 IO (io), 53 IO (DQ0R7) (io), 54 IO (DQ0R6) (io), 55 IO (DQ0R5) (io), 56 IO (DQ0R4) (io), 57 IO, VREF2B3 (io), 65 IO (DM0R) (io), 68 IO, VREF1B3 (io), 69 IO (DQ0R3) (io), 70 IO (DQ0R2) (io), 71 IO (DQ0R1) (io), 72 IO, DPCLK4 (DQS0R) (io), 73 IO, VREF0B3 (io), 74 IO (DQ0R0) (io), 75 IO (io)
part D pins: 26 IO (io), 27 IO (DQ1B7) (io), 28 IO (DQ1B6) (io), 29 IO (DQ1B5) (io), 34 IO, DPCLK7 (DQS1B) (io), 35 IO, VREF2B4 (io), 36 IO (DQ1B4) (io), 37 IO (io), 38 IO, VREF1B4 (io), 39 IO (DM1B) (io), 40 IO (io), 41 IO, VREF0B4 (io), 42 IO, DPCLK6 (DQS0B) (io), 47 IO (DQ1B3) (io), 48 IO (DQ1B2) (io), 49 IO (DQ1B1) (io), 50 IO (DQ1B0) (io)
part E pins: 7 DATA0 (in), 8 nCONFIG (in), 12 nCEO (out), 13 nCE (in), 14 MSEL0 (in), 15 MSEL1 (in), 16 DCLK (io), 60 CONF_DONE (io), 61 nSTATUS (io), 62 TCK (in), 63 TMS (in), 64 TDO (out), 67 TDI (in)
part F pins: 18 VCCIO1 (power), 31 VCCIO4 (power), 33 VCCINT (power), 44 VCCINT (power), 46 VCCIO4 (power), 59 VCCIO3 (power), 80 VCCIO2 (power), 82 VCCINT (power), 93 VCCINT (power), 95 VCCIO2 (power)
part G pins: 19 GND (power), 30 GND (power), 32 GND (power), 43 GND (power), 45 GND (power), 58 GND (power), 81 GND (power), 83 GND (power), 94 GND (power), 96 GND (power)
part H pins: 9 VCCA_PLL1 (power), 11 GNDA_PLL1 (power)
part I pins: 10 CLK0 (in), 66 CLK2 (in)
part A text: BANK 1
part B text: BANK 2
part C text: BANK 3
part D text: BANK 4